# Altium footprint library IC.PcbLib: 44 footprints (part 1 of 3)
Each footprint in its own frame and in the unit in brackets; x right, y up, seen from the top. Pads: shape width x height; smd on the part's side, far side on the other; paste and mask are expansions set on the pad; w line width, h text height; cw(c..) or ccw(c..) is an arc to the next point about the centre after c.
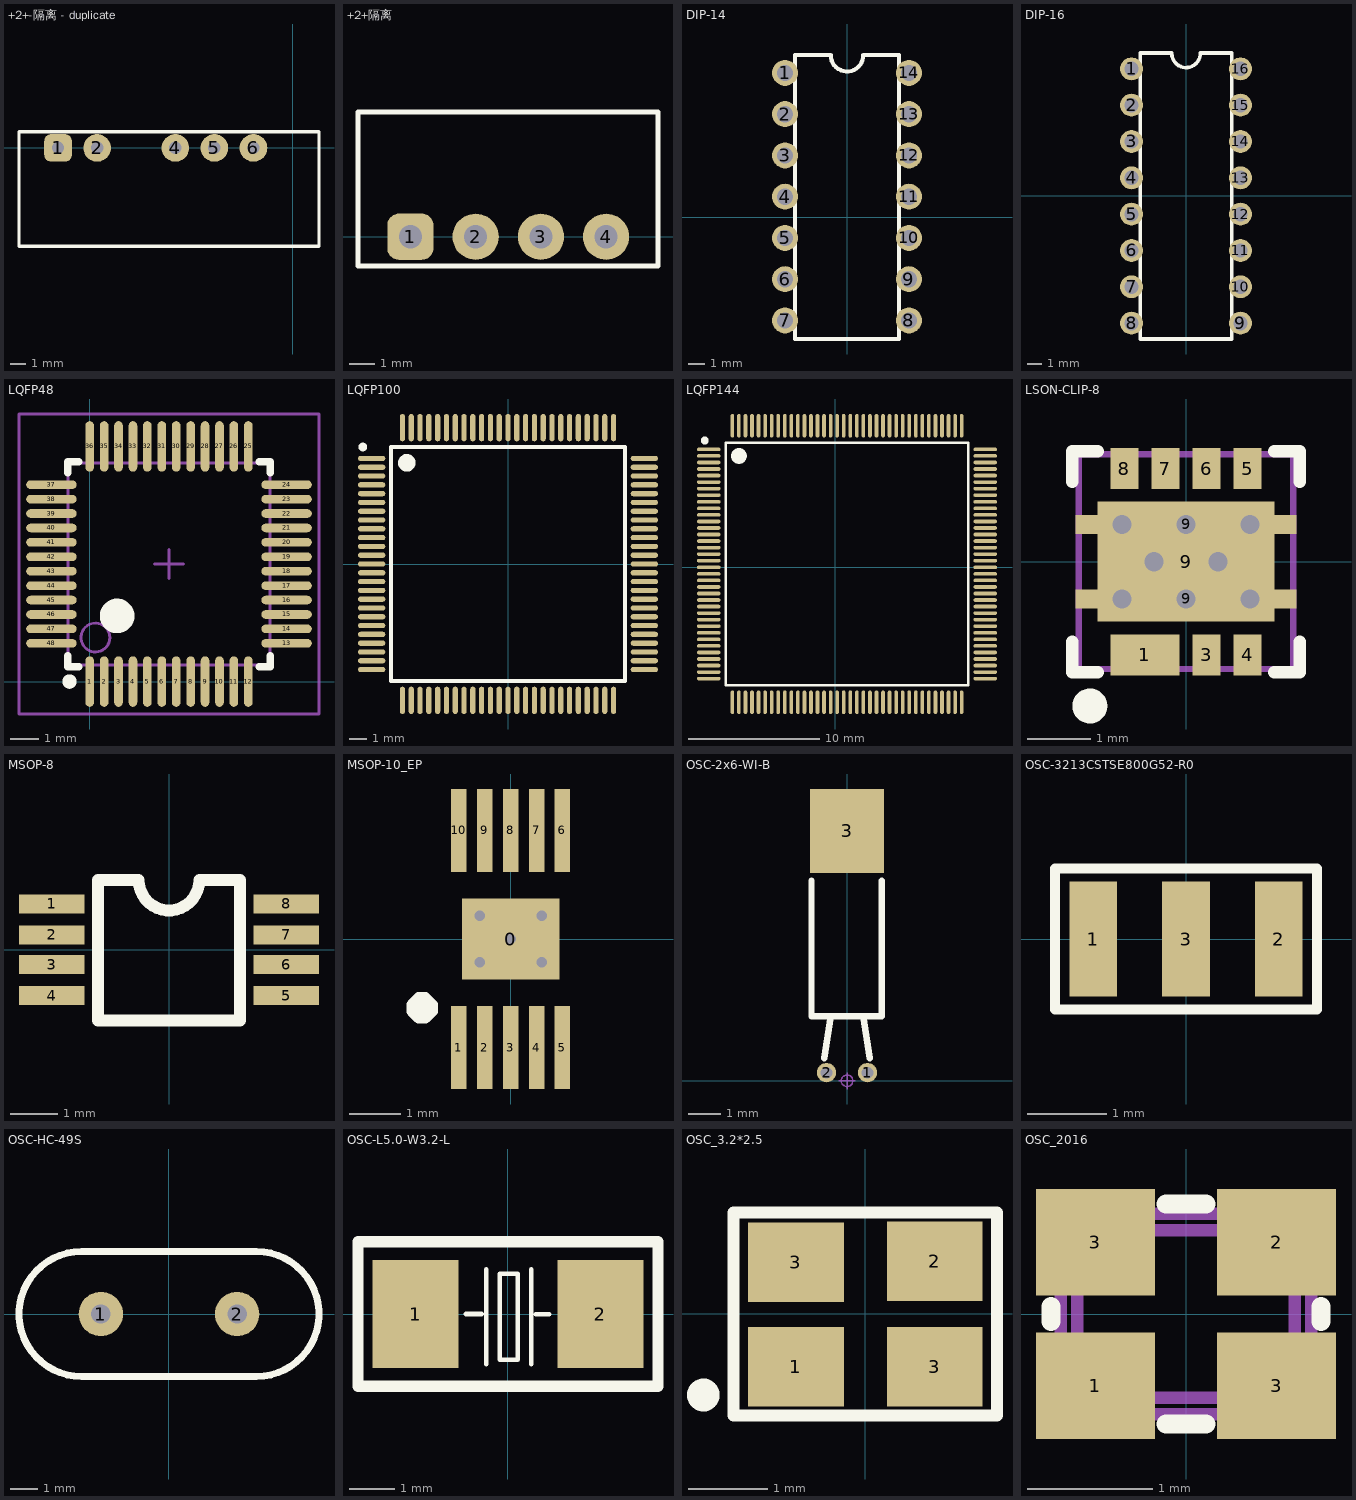
[diagram p0: the footprints below, top view; thin cyan lines are the x and y axes]

## +2+-隔离 - duplicate [mm]
pads (5):
  rrect50% 1.8x1.8 hole 0.8: 1(-15.24,0)
  round 1.8 hole 0.8: 2(-12.7,0) 4(-7.62,0) 5(-5.08,0) 6(-2.54,0)
Top Overlay:
  lines w0.2: -17.78,-6.393 1.72,-6.393 1.72,1.05 -17.78,1.05 -17.78,-5.25 -17.78,-6.393
3D body: height 10, standoff 0.5, extent -17.78,-6.393 1.72,1.05

## +2+隔离 [mm]
height 11.5
pads (4):
  rrect50% 1.8x1.8 hole 0.9: 1(-15.24,0)
  round 1.8 hole 0.9: 2(-12.7,0) 3(-10.16,0) 4(-7.62,0)
Top Overlay:
  lines w0.2: -17.28,-1.143 -17.28,0 -17.28,4.857 -5.6,4.857 -5.6,-1.143 -17.28,-1.143
3D body: height 11.5, standoff 0.5, extent -17.272,-1.143 -5.588,4.826

## DIP-14 [mm]
pads (14):
  round 1.6 hole 1: 1(-3.81,8.89) 2(-3.81,6.35) 3(-3.81,3.81) 4(-3.81,1.27) 5(-3.81,-1.27) 6(-3.81,-3.81) 7(-3.81,-6.35) 8(3.81,-6.35) 9(3.81,-3.81) 10(3.81,-1.27) 11(3.81,1.27) 12(3.81,3.81) 13(3.81,6.35) 14(3.81,8.89)
Top Overlay:
  lines w0.254: -1,9.95 ccw(c0,9.975) 1,10 ; -1,10 -3.2,10 -3.2,-7.493 3.2,-7.493 3.2,10 ; 0.998,10 3.198,10

## DIP-16 [mm]
pads (16):
  round 1.6 hole 1: 1(-3.81,8.89) 2(-3.81,6.35) 3(-3.81,3.81) 4(-3.81,1.27) 5(-3.81,-1.27) 6(-3.81,-3.81) 7(-3.81,-6.35) 8(-3.81,-8.89) 9(3.81,-8.89) 10(3.81,-6.35) 11(3.81,-3.81) 12(3.81,-1.27) 13(3.81,1.27) 14(3.81,3.81) 15(3.81,6.35) 16(3.81,8.89)
Top Overlay:
  lines w0.254: -1,9.95 ccw(c0,9.975) 1,10 ; -1,10 -3.2,10 -3.2,-10 3.2,-10 3.2,10 ; 0.998,10 3.198,10

## LQFP48 [mm]
pads (48):
  oval 0.3x1.75 smd: 1(0,0) 2(0.5,0) 3(1,0) 4(1.5,0) 5(2,0) 6(2.5,0) 7(3,0) 8(3.5,0) 9(4,0) 10(4.5,0) 11(5,0) 12(5.5,0) 25(5.5,8.15) 26(5,8.15) 27(4.5,8.15) 28(4,8.15) 29(3.5,8.15) 30(3,8.15) 31(2.5,8.15) 32(2,8.15) 33(1.5,8.15) 34(1,8.15) 35(0.5,8.15) 36(0,8.15)
  oval 1.75x0.3 smd: 13(6.825,1.325) 14(6.825,1.825) 15(6.825,2.325) 16(6.825,2.825) 17(6.825,3.325) 18(6.825,3.825) 19(6.825,4.325) 20(6.825,4.825) 21(6.825,5.325) 22(6.825,5.825) 23(6.825,6.325) 24(6.825,6.825) 37(-1.325,6.825) 38(-1.325,6.325) 39(-1.325,5.825) 40(-1.325,5.325) 41(-1.325,4.825) 42(-1.325,4.325) 43(-1.325,3.825) 44(-1.325,3.325) 45(-1.325,2.825) 46(-1.325,2.325) 47(-1.325,1.825) 48(-1.325,1.325)
Top Overlay:
  circle w0.6: c0.95,2.275 r0.3
  circle w0.25: c-0.7,0 r0.125
  lines w0.254: -0.762,0.889 -0.762,0.508 -0.381,0.508 ; -0.762,7.239 -0.762,7.62 -0.381,7.62 ; 5.882,0.508 6.263,0.508 6.263,0.889 ; 5.882,7.62 6.263,7.62 6.263,7.239
Mechanical 13:
  circle w0.1: c0.2,1.525 r0.5
  lines w0.1: -0.75,0.575 -0.75,7.575 6.25,7.575 6.25,0.575 -0.75,0.575
Mechanical 15:
  lines w0.1: 2.25,4.075 3.25,4.075 ; 2.75,3.575 2.75,4.575 ; -2.45,-1.125 -2.45,9.275 7.95,9.275 7.95,-1.125 -2.45,-1.125
3D body: height 1.6, standoff 0, extent -0.75,0.575 6.25,7.575

## LQFP100 [mm] "100-pin low-profile quad flat"
pads (100):
  oval 1.55x0.3 smd: 1(-7.75,6) 2(-7.75,5.5) 3(-7.75,5) 4(-7.75,4.5) 5(-7.75,4) 6(-7.75,3.5) 7(-7.75,3) 8(-7.75,2.5) 9(-7.75,2) 10(-7.75,1.5) 11(-7.75,1) 12(-7.75,0.5) 13(-7.75,0) 14(-7.75,-0.5) 15(-7.75,-1) 16(-7.75,-1.5) 17(-7.75,-2) 18(-7.75,-2.5) 19(-7.75,-3) 20(-7.75,-3.5) 21(-7.75,-4) 22(-7.75,-4.5) 23(-7.75,-5) 24(-7.75,-5.5) 25(-7.75,-6) 51(7.75,-6) 52(7.75,-5.5) 53(7.75,-5) 54(7.75,-4.5) 55(7.75,-4) 56(7.75,-3.5) 57(7.75,-3) 58(7.75,-2.5) 59(7.75,-2) 60(7.75,-1.5) 61(7.75,-1) 62(7.75,-0.5) 63(7.75,0) 64(7.75,0.5) 65(7.75,1) 66(7.75,1.5) 67(7.75,2) 68(7.75,2.5) 69(7.75,3) 70(7.75,3.5) 71(7.75,4) 72(7.75,4.5) 73(7.75,5) 74(7.75,5.5) 75(7.75,6)
  oval 0.3x1.55 smd: 26(-6,-7.75) 27(-5.5,-7.75) 28(-5,-7.75) 29(-4.5,-7.75) 30(-4,-7.75) 31(-3.5,-7.75) 32(-3,-7.75) 33(-2.5,-7.75) 34(-2,-7.75) 35(-1.5,-7.75) 36(-1,-7.75) 37(-0.5,-7.75) 38(0,-7.75) 39(0.5,-7.75) 40(1,-7.75) 41(1.5,-7.75) 42(2,-7.75) 43(2.5,-7.75) 44(3,-7.75) 45(3.5,-7.75) 46(4,-7.75) 47(4.5,-7.75) 48(5,-7.75) 49(5.5,-7.75) 50(6,-7.75) 76(6,7.75) 77(5.5,7.75) 78(5,7.75) 79(4.5,7.75) 80(4,7.75) 81(3.5,7.75) 82(3,7.75) 83(2.5,7.75) 84(2,7.75) 85(1.5,7.75) 86(1,7.75) 87(0.5,7.75) 88(0,7.75) 89(-0.5,7.75) 90(-1,7.75) 91(-1.5,7.75) 92(-2,7.75) 93(-2.5,7.75) 94(-3,7.75) 95(-3.5,7.75) 96(-4,7.75) 97(-4.5,7.75) 98(-5,7.75) 99(-5.5,7.75) 100(-6,7.75)
Top Overlay:
  circle w0.25: c-8.25,6.65 r0.125
  circle w0.5: c-5.75,5.75 r0.25
  lines w0.2: -6.65,-6.65 6.65,-6.65 6.65,6.65 -6.65,6.65 -6.65,-6.65
3D body "User Library-LQFP100.step": height 1.6, standoff 0, extent -8,-8 8,8

## LQFP144 [mm]
pads (144):
  oval 1.796x0.28 smd: 1(-9.661,9.004) 2(-9.661,8.504) 3(-9.661,8.004) 4(-9.661,7.504) 5(-9.661,7.004) 6(-9.661,6.504) 7(-9.661,6.004) 8(-9.661,5.504) 9(-9.661,5.004) 10(-9.661,4.504) 11(-9.661,4.004) 12(-9.661,3.504) 13(-9.661,3.004) 14(-9.661,2.504) 15(-9.661,2.004) 16(-9.661,1.504) 17(-9.661,1.004) 18(-9.661,0.504) 19(-9.661,0.004) 20(-9.661,-0.496) 21(-9.661,-0.996) 22(-9.661,-1.496) 23(-9.661,-1.996) 24(-9.661,-2.496) 25(-9.661,-2.996) 26(-9.661,-3.496) 27(-9.661,-3.996) 28(-9.661,-4.496) 29(-9.661,-4.996) 30(-9.661,-5.496) 31(-9.661,-5.996) 32(-9.661,-6.496) 33(-9.661,-6.996) 34(-9.661,-7.496) 35(-9.661,-7.996) 36(-9.661,-8.496) 73(11.439,-8.496) 74(11.439,-7.996) 75(11.439,-7.496) 76(11.439,-6.996) 77(11.439,-6.496) 78(11.439,-5.996) 79(11.439,-5.496) 80(11.439,-4.996) 81(11.439,-4.496) 82(11.439,-3.996) 83(11.439,-3.496) 84(11.439,-2.996) 85(11.439,-2.496) 86(11.439,-1.996) 87(11.439,-1.496) 88(11.439,-0.996) 89(11.439,-0.496) 90(11.439,0.004) 91(11.439,0.504) 92(11.439,1.004) 93(11.439,1.504) 94(11.439,2.004) 95(11.439,2.504) 96(11.439,3.004) 97(11.439,3.504) 98(11.439,4.004) 99(11.439,4.504) 100(11.439,5.004) 101(11.439,5.504) 102(11.439,6.004) 103(11.439,6.504) 104(11.439,7.004) 105(11.439,7.504) 106(11.439,8.004) 107(11.439,8.504) 108(11.439,9.004)
  oval 0.28x1.796 smd: 37(-7.861,-10.296) 38(-7.361,-10.296) 39(-6.861,-10.296) 40(-6.361,-10.296) 41(-5.861,-10.296) 42(-5.361,-10.296) 43(-4.861,-10.296) 44(-4.361,-10.296) 45(-3.861,-10.296) 46(-3.361,-10.296) 47(-2.861,-10.296) 48(-2.361,-10.296) 49(-1.861,-10.296) 50(-1.361,-10.296) 51(-0.861,-10.296) 52(-0.361,-10.296) 53(0.139,-10.296) 54(0.639,-10.296) 55(1.139,-10.296) 56(1.639,-10.296) 57(2.139,-10.296) 58(2.639,-10.296) 59(3.139,-10.296) 60(3.639,-10.296) 61(4.139,-10.296) 62(4.639,-10.296) 63(5.139,-10.296) 64(5.639,-10.296) 65(6.139,-10.296) 66(6.639,-10.296) 67(7.139,-10.296) 68(7.639,-10.296) 69(8.139,-10.296) 70(8.639,-10.296) 71(9.139,-10.296) 72(9.639,-10.296) 109(9.639,10.804) 110(9.139,10.804) 111(8.639,10.804) 112(8.139,10.804) 113(7.639,10.804) 114(7.139,10.804) 115(6.639,10.804) 116(6.139,10.804) 117(5.639,10.804) 118(5.139,10.804) 119(4.639,10.804) 120(4.139,10.804) 121(3.639,10.804) 122(3.139,10.804) 123(2.639,10.804) 124(2.139,10.804) 125(1.639,10.804) 126(1.139,10.804) 127(0.639,10.804) 128(0.139,10.804) 129(-0.361,10.804) 130(-0.861,10.804) 131(-1.361,10.804) 132(-1.861,10.804) 133(-2.361,10.804) 134(-2.861,10.804) 135(-3.361,10.804) 136(-3.861,10.804) 137(-4.361,10.804) 138(-4.861,10.804) 139(-5.361,10.804) 140(-5.861,10.804) 141(-6.361,10.804) 142(-6.861,10.804) 143(-7.361,10.804) 144(-7.861,10.804)
Top Overlay:
  lines w0.2: -8.361,-8.996 10.139,-8.996 10.139,9.504 -8.361,9.504 -8.361,-8.996
  lines w0.3: -9.812,9.677 cw(c-9.962,9.679) -9.812,9.68
  lines w0.6: -7.061,8.499 cw(c-7.361,8.501) -7.061,8.504
3D body: height 0.63, standoff -0.63, extent 1.905,0.762 1.905,0.762
3D body "User Library-STM32F103ZET6.STEP": height 0.7, standoff -0.85, extent -1281,-1281 -1259,-1259
3D body: height 0.63, standoff -0.63, extent 3.937,-1.27 3.937,-1.27
3D body "User Library-STM32F103ZET6.STEP": height 0.7, standoff -0.85, extent -10.033,-10.746 11.967,11.254

## LSON-CLIP-8 [mm] "半桥NMOS"
height 1.55
pads (10):
  rect 1.09x0.65 smd: 1(-0.65,-1.475)
  rect 0.44x0.65 smd: 3(0.325,-1.475) 4(0.975,-1.475) 5(0.975,1.475) 6(0.325,1.475) 7(-0.325,1.475) 8(-0.975,1.475)
  rect 3.5x0.3 smd: 9(0,-0.59) 9(0,0.59)
  rect 2.8x1.9 smd: 9(0,0)
via -1.016,0.59 diameter 0.61 hole 0.305
via -1.016,-0.59 diameter 0.61 hole 0.305
via -0.508,0 diameter 0.61 hole 0.305
via 0,-0.59 diameter 0.61 hole 0.305
via 0,0.59 diameter 0.61 hole 0.305
via 0.508,0 diameter 0.61 hole 0.305
via 1.016,0.59 diameter 0.61 hole 0.305
via 1.016,-0.59 diameter 0.61 hole 0.305
Top Overlay:
  circle w0.3: c-1.524,-2.286 r0.127
  lines w0.2: -1.8,-1.27 -1.8,-1.75 -1.397,-1.75 ; -1.8,1.27 -1.8,1.75 -1.397,1.75 ; 1.397,-1.75 1.8,-1.75 1.8,-1.27 ; 1.397,1.75 1.8,1.75 1.8,1.27
Mechanical 13:
  lines w0.1: -1.7,-1.7 1.7,-1.7 1.7,1.7 -1.7,1.7 -1.7,-1.7
3D body: height 1.6, standoff 0, extent -1.7,-1.7 1.7,1.7

## MSOP-8 [mil]
pads (8):
  rect 55x16 smd: 1(-98.5,38.5) 2(-98.5,12.5) 3(-98.5,-12.5) 4(-98.5,-38.5) 5(98.5,-38.5) 6(98.5,-12.5) 7(98.5,12.5) 8(98.5,38.5)
Top Overlay:
  lines w10: -59.5,58.5 -25.5,58.5 ccw(c0,58.5) 25.5,58.5 59.5,58.5 59.5,-59.61 ; -59.5,58.61 -59.5,-59.5 58.61,-59.5

## MSOP-10_EP [mm] "epad"
height 1.1
pads (11):
  rect 1.88x1.57 smd: 0(0,0)
  rect 0.3x1.6 smd mask+0.05: 1(-1,-2.1) 2(-0.5,-2.1) 3(0,-2.1) 4(0.5,-2.1) 5(1,-2.1) 6(1,2.1) 7(0.5,2.1) 8(0,2.1) 9(-0.5,2.1) 10(-1,2.1)
via 0,0 diameter 0.35 hole 0.2
via -0.6,-0.45 diameter 0.35 hole 0.2
via 0.6,0.45 diameter 0.35 hole 0.2
via -0.6,0.45 diameter 0.35 hole 0.2
via 0.6,-0.45 diameter 0.35 hole 0.2
Top Overlay:
  lines w0.229: -1.778,-1.397 -1.651,-1.524 ; -1.651,-1.524 -1.651,-1.143 ; -1.651,-1.524 -1.524,-1.397 -1.524,-1.27 ; -1.651,-1.524 -1.778,-1.524 -1.905,-1.397 -1.905,-1.27 -1.778,-1.143 -1.651,-1.143 ; -1.651,-1.143 -1.524,-1.27 ; -1.651,-1.143 -1.524,-1.27
3D body: height 1, standoff 0.1, extent -1.5,-1.5 1.5,1.5

## OSC-2x6-WI-B [mm] "脚距：1.6mm"
pads (3):
  round 0.6 hole 0.36: 1(0.635,0.254) 2(-0.635,0.254)
  rect 2.3x2.6 smd: 3(0,7.747)
Top Overlay:
  lines w0.2: -1.1,6.2 -1.1,2 1.072,2 1.072,6.2 ; -0.7,0.7 -0.5,2 ; 0.5,2 0.7,0.7
Mechanical 15:
  circle w0.04: c0,0 r0.18
  lines w0.04: -0.254,0 0.254,0 ; 0,-0.254 0,0.254
3D body "OSC-2x6-WI.STEP": height 2.05, standoff -2.6, extent -1,0.097 1,8.254

## OSC-3213CSTSE800G52-R0 [mm]
pads (3):
  rect 0.6x1.45 smd: 1(-1.168,0) 2(1.168,0) 3(0,0)
Top Overlay:
  lines w0.127: -1.651,-0.889 1.651,-0.889 1.651,0.889 -1.651,0.889 -1.651,-0.889
3D body: height 0.5, standoff 0, extent -1.549,-0.762 1.524,0.762
3D body "SW3dPS-CSTCE.STEP": height 0.7, standoff 0, extent -1.613,-0.65 1.587,0.65

## OSC-HC-49S [mm]
pads (2):
  round 1.6 hole 0.7: 1(-2.45,0) 2(2.45,0)
Top Overlay:
  lines w0.254: -3.15,-2.248 cw(c-3.15,0) -3.15,2.248 3.15,2.248 cw(c3.15,0) 3.15,-2.248 -3.15,-2.248
3D body "hc-49s_n.stp": height 3.6, standoff -2.9, extent -5.388,-2.27 5.412,2.23

## OSC-L5.0-W3.2-L [mm]
pads (2):
  rect 1.9x2.4 smd: 1(-2.05,0) 2(2.05,0)
Top Overlay:
  lines w0.1: -0.94,0 -0.584,0 ; -0.483,-1.109 -0.483,0.991 ; 0.517,-1.109 0.517,0.991 ; 0.617,-0.009 0.917,-0.009 ; -0.183,-1.009 0.217,-1.009 0.217,0.89 -0.183,0.89 -0.183,-1.009
  lines w0.254: -3.325,-1.6 -3.325,-0.7 -3.325,0.7 -3.325,1.6 3.325,1.6 3.325,0.7 3.325,-0.7 3.325,-1.6 -3.325,-1.6
3D body "User Library-ABM3-1.STEP": height 1.3, standoff 0, extent -2.5,-1.5 2.5,1.7

## OSC_3.2*2.5 [mm]
pads (4):
  rect 1.2x1 smd mask+0.1: 1(-0.87,-0.66) 2(0.87,0.66) 3(-0.87,0.65) 3(0.87,-0.66)
Top Overlay:
  circle w0.254: c-2.032,-1.016 r0.079
  lines w0.15: -1.651,-1.27 1.651,-1.27 1.651,1.27 -1.651,1.27 -1.651,-1.27
3D body "User Library-User Library-Siward_SX3225.step": height 0.81, standoff 0, extent -1.6,-1.25 1.6,1.25

## OSC_2016 [mm] "Crystal 2.0 x 1.6 mm"
height 0.5
pads (4):
  rect 0.95x0.85 smd: 1(-0.725,-0.575) 2(0.725,0.575) 3(-0.725,0.575) 3(0.725,-0.575)
Top Overlay:
  lines w0.152: -1.08,-0.06 -1.08,0.06 ; -0.16,-0.88 0.16,-0.88 ; -0.16,0.88 0.16,0.88 ; 1.08,-0.06 1.08,0.06
Mechanical 7:
  lines w0.1: -1,-0.7 cw(c-1,-0.8) -0.9,-0.8 0.9,-0.8 cw(c1,-0.8) 1,-0.7 1,0.7 cw(c1,0.8) 0.9,0.8 -0.9,0.8 cw(c-1,0.8) -1,0.7 -1,-0.7 ; -0.87,-0.57 ccw(c-0.77,-0.57) -0.77,-0.67 0.77,-0.67 ccw(c0.77,-0.57) 0.87,-0.57 0.87,0.57 ccw(c0.77,0.57) 0.77,0.67 -0.77,0.67 ccw(c-0.77,0.57) -0.87,0.57 -0.87,-0.57
3D body: height 0.56, standoff 0.15, extent -0.7,-0.65 0.7,0.65
3D body "User Library-GeyerElectronics_KX5.step": height 0.56, standoff 0, extent -1.05,-0.85 1.05,0.85